# Altium integrated library ATK-DLAM62LB V1.0.IntLib: 194 symbols
Pins are listed as number, name and electrical type; pins without a type are passive.

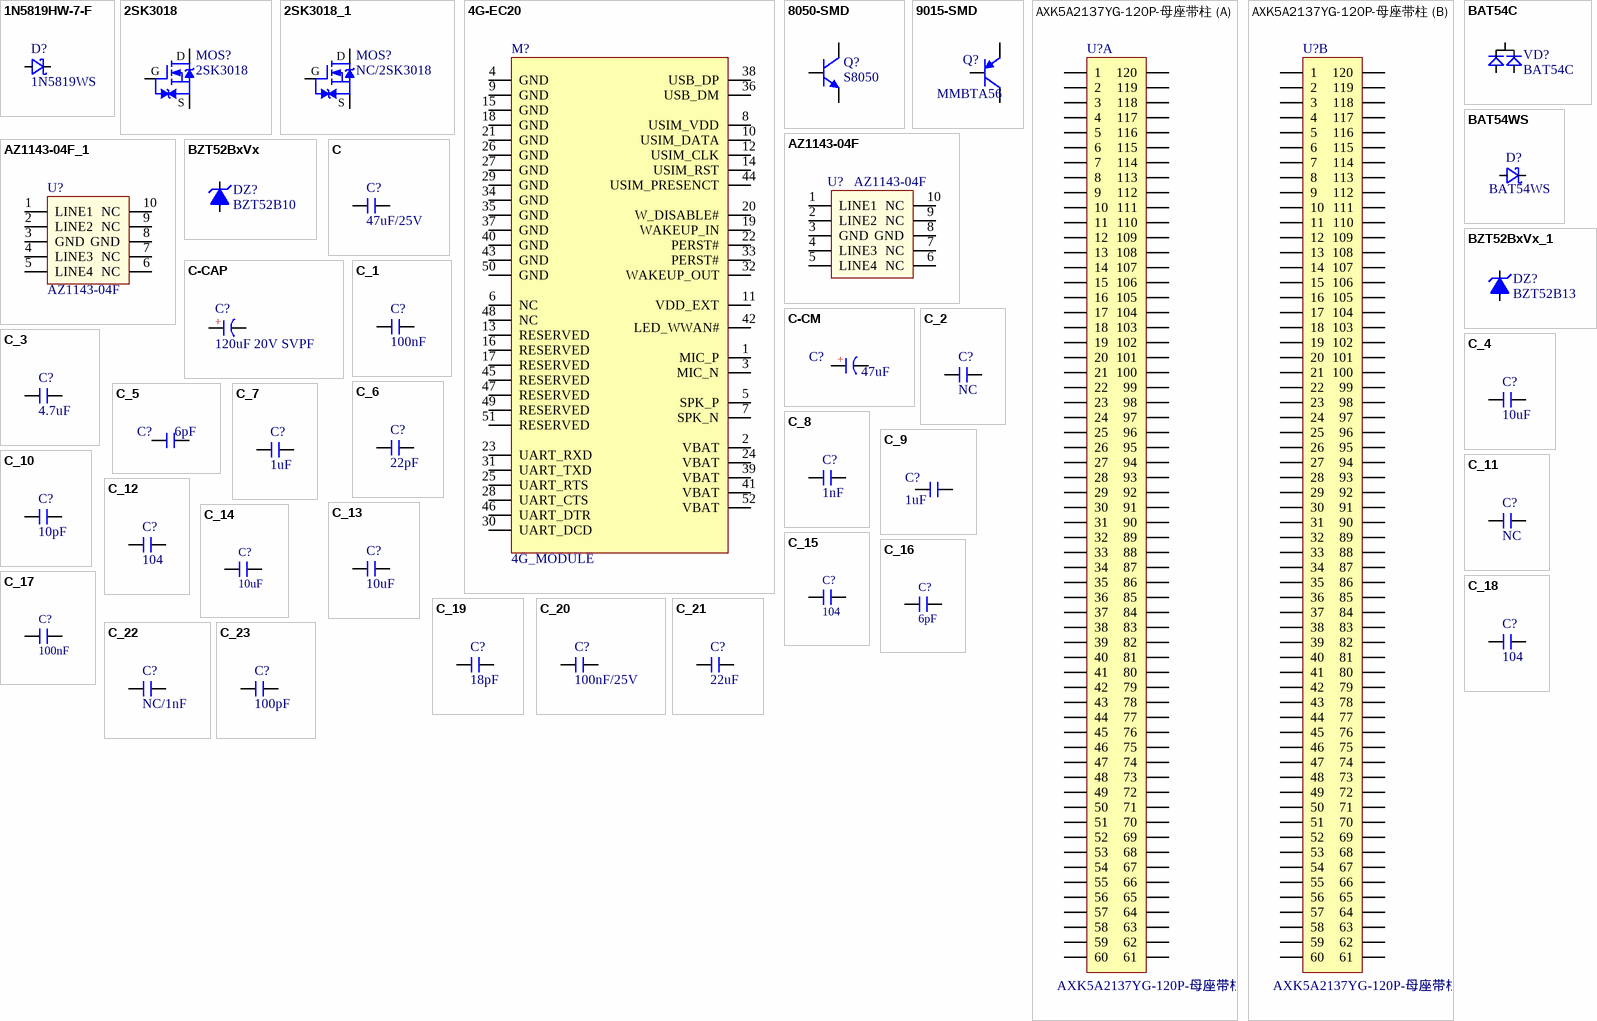
[diagram p0: symbols 1N5819HW-7-F to C_23]

## 1N5819HW-7-F
designator D?, comment 1N5819WS
肖特基二极管 40V  450mV@1A; 版权归属: 正点原子; 学习资源: www.openedv.com; Parameter: 肖特基二极管
footprint SOD-123 (2.7x1.6X1.1mm（长宽高，不包括引脚）)
footprint SOD-123FL (2.7x1.6X1.1mm（长宽高，不包括引脚）)
footprint SOD-323 (1.8x1.3X0.9mm（长宽高，不包括引脚）)
footprint SOD-123 (二极管)
pins: 1 A, 2 K

## 2SK3018
designator MOS?
NMOS  30V 0.1A@2.5V 8Ω; BOM名称: N沟场效应管; 版权归属: 正点原子; Parameter: MOS管; 学习资源: www.openedv.com
footprint SOT323-3L (2x2.2x0.9mm(长宽高))
footprint SOT323-3M (2x2.2x0.9mm(长宽高))
footprint SOT323-3N (2x2.2x0.9mm(长宽高))
footprint SOT23-3L (3x1.3x1mm(长宽高))
footprint SOT23-3N (3x1.3x1mm(长宽高))
footprint SOT23-3M (3x1.3x1mm(长宽高))
pins: 1 G, 2 S, 3 D

## 2SK3018_1
designator MOS?, comment NC/2SK3018
NMOS  30V 0.1A@2.5V 8Ω; BOM名称: N沟场效应管; 版权归属: 正点原子; Parameter: MOS管; 学习资源: www.openedv.com
footprint SOT323-3L (2x2.2x0.9mm(长宽高))
footprint SOT323-3M (2x2.2x0.9mm(长宽高))
footprint SOT323-3N (2x2.2x0.9mm(长宽高))
footprint SOT23-3L (3x1.3x1mm(长宽高))
footprint SOT23-3N (3x1.3x1mm(长宽高))
footprint SOT23-3M (3x1.3x1mm(长宽高))
footprint SOT323-3L (2x2.2x0.9mm(长宽高))
pins: 1 G, 2 S, 3 D

## 4G-EC20
designator M?, comment 4G_MODULE
Mini PCIE座子52P; 版权归属: 正点原子; Parameter: 接口器件; 学习资源: www.openedv.com
footprint Mini PCIE 52P
pins: 1 MIC_P, 2 VBAT, 3 MIC_N, 4 GND, 5 SPK_P, 6 NC, 7 SPK_N, 8 USIM_VDD, 9 GND, 10 USIM_DATA, 11 VDD_EXT, 12 USIM_CLK, 13 RESERVED, 14 USIM_RST, 15 GND, 16 RESERVED, 17 RESERVED, 18 GND, 19 WAKEUP_IN, 20 W_DISABLE#, 21 GND, 22 PERST#, 23 UART_RXD, 24 VBAT, 25 UART_RTS, 26 GND, 27 GND, 28 UART_CTS, 29 GND, 30 UART_DCD, 31 UART_TXD, 32 WAKEUP_OUT, 33 PERST#, 34 GND, 35 GND, 36 USB_DM, 37 GND, 38 USB_DP, 39 VBAT, 40 GND, 41 VBAT, 42 LED_WWAN#, 43 GND, 44 USIM_PRESENCT, 45 RESERVED, 46 UART_DTR, 47 RESERVED, 48 NC, 49 RESERVED, 50 GND, 51 RESERVED, 52 VBAT

## 8050-SMD
designator Q?, comment S8050
高频放大-NPN型; 版权归属: 正点原子; 属性: 40V 1.5A 1W 100MHZ; Parameter: 三极管; BOM名称: 高频放大-NPN型; 学习资源: www.ooocke.com
footprint SOT23-3N
footprint SOT23-3L (3x1.3x1mm(长宽高))
footprint SOT23-3M (3x1.3x1mm(长宽高))
footprint SOT323-3L (2x2.2x0.9mm(长宽高))
footprint SOT323-3N (2x2.2x0.9mm(长宽高))
footprint SOT323-3M (2x2.2x0.9mm(长宽高))
pins: 1 B, 2 E, 3 C

## 9015-SMD
designator Q?, comment MMBTA56
低噪放大-PNP型; BOM名称: 三极管; 版权归属: 正点原子; 属性: 50V 0.1A 0.4W 150MHZ; 学习资源: www.ooocke.com
footprint SOT23-3N (3x1.3x1mm(长宽高))
footprint SOT23-3L (3x1.3x1mm(长宽高))
footprint SOT23-3M (3x1.3x1mm(长宽高))
pins: 1 B, 2 E, 3 C

## AXK5A2137YG-120P-母座带柱
designator U?
footprint ATK-CLAM62LB-CORE (Footprint not found)
part A pins: A1 1, A2 2, A3 3, A4 4, A5 5, A6 6, A7 7, A8 8, A9 9, A10 10, A11 11, A12 12, A13 13, A14 14, A15 15, A16 16, A17 17, A18 18, A19 19, A20 20, A21 21, A22 22, A23 23, A24 24, A25 25, A26 26, A27 27, A28 28, A29 29, A30 30, A31 31, A32 32, A33 33, A34 34, A35 35, A36 36, A37 37, A38 38, A39 39, A40 40, A41 41, A42 42, A43 43, A44 44, A45 45, A46 46, A47 47, A48 48, A49 49, A50 50, A51 51, A52 52, A53 53, A54 54, A55 55, A56 56, A57 57, A58 58, A59 59, A60 60, A61 61, A62 62, A63 63, A64 64, A65 65, A66 66, A67 67, A68 68, A69 69, A70 70, A71 71, A72 72, A73 73, A74 74, A75 75, A76 76, A77 77, A78 78, A79 79, A80 80, A81 81, A82 82, A83 83, A84 84, A85 85, A86 86, A87 87, A88 88, A89 89, A90 90, A91 91, A92 92, A93 93, A94 94, A95 95, A96 96, A97 97, A98 98, A99 99, A100 100, A101 101, A102 102, A103 103, A104 104, A105 105, A106 106, A107 107, A108 108, A109 109, A110 110, A111 111, A112 112, A113 113, A114 114, A115 115, A116 116, A117 117, A118 118, A119 119, A120 120
part B pins: B1 1, B2 2, B3 3, B4 4, B5 5, B6 6, B7 7, B8 8, B9 9, B10 10, B11 11, B12 12, B13 13, B14 14, B15 15, B16 16, B17 17, B18 18, B19 19, B20 20, B21 21, B22 22, B23 23, B24 24, B25 25, B26 26, B27 27, B28 28, B29 29, B30 30, B31 31, B32 32, B33 33, B34 34, B35 35, B36 36, B37 37, B38 38, B39 39, B40 40, B41 41, B42 42, B43 43, B44 44, B45 45, B46 46, B47 47, B48 48, B49 49, B50 50, B51 51, B52 52, B53 53, B54 54, B55 55, B56 56, B57 57, B58 58, B59 59, B60 60, B61 61, B62 62, B63 63, B64 64, B65 65, B66 66, B67 67, B68 68, B69 69, B70 70, B71 71, B72 72, B73 73, B74 74, B75 75, B76 76, B77 77, B78 78, B79 79, B80 80, B81 81, B82 82, B83 83, B84 84, B85 85, B86 86, B87 87, B88 88, B89 89, B90 90, B91 91, B92 92, B93 93, B94 94, B95 95, B96 96, B97 97, B98 98, B99 99, B100 100, B101 101, B102 102, B103 103, B104 104, B105 105, B106 106, B107 107, B108 108, B109 109, B110 110, B111 111, B112 112, B113 113, B114 114, B115 115, B116 116, B117 117, B118 118, B119 119, B120 120

## AZ1143-04F
designator U?
ESD保护二极管阵列
footprint DFN2510P10E
pins: 1 LINE1, 2 LINE2, 3 GND, 4 LINE3, 5 LINE4, 6 NC, 7 NC, 8 GND, 9 NC, 10 NC

## AZ1143-04F_1
designator U?, comment AZ1143-04F
ESD保护二极管阵列
footprint DFN2510P10E
pins: 1 LINE1, 2 LINE2, 3 GND, 4 LINE3, 5 LINE4, 6 NC, 7 NC, 8 GND, 9 NC, 10 NC

## BAT54C
designator VD?
肖特基二极管（双）
footprint SOT23-3N
footprint SOT23-3L (3x1.3x1mm(长宽高))
footprint SOT23-3M (3x1.3x1mm(长宽高))
pins: 1, 2, 3

## BAT54WS
designator D?
肖特基二极管 30V  1V@100mA; 版权归属: 正点原子; 学习资源: www.openedv.com; Parameter: 肖特基二极管
footprint SOD-323
pins: 1 A, 2 K

## BZT52BxVx
designator DZ?, comment BZT52B10
CJ x.xV / 0.5W稳压管  2%; 版权归属: 正点原子; BOM名称: 二极管(稳压); 学习资源: www.openedv.com
footprint SOD-123 (2.7x1.6X1.1mm（长宽高，不包括引脚）)
footprint SMB (二极管 SMB)
footprint SOD-123
pins: 1 A, 2 K

## BZT52BxVx_1
designator DZ?, comment BZT52B13
CJ x.xV / 0.5W稳压管  2%; 版权归属: 正点原子; BOM名称: 二极管(稳压); 学习资源: www.openedv.com
footprint SOD-123 (2.7x1.6X1.1mm（长宽高，不包括引脚）)
footprint Model Name (Model Description)
footprint Model Name (Model Description)
footprint SMB (二极管 SMB)
footprint SOD-123 (二极管)
pins: 1 A, 2 K

## C
designator C?, comment 47uF/25V
无极性电容; BOM名称: 无极性贴片电容; 版权归属: 正点原子; 学习资源: www.openedv.com
footprint C 0201 (无极性贴片电容)
footprint C 0402 (无极性贴片电容)
footprint C 0603 (无极性贴片电容)
footprint C 0805 (无极性贴片电容)
footprint C 1206 (无极性贴片电容)
footprint C 1210 (无极性贴片电容)
footprint C 1808 (无极性贴片电容)
footprint C 1812 (无极性贴片电容)
footprint C 1825 (无极性贴片电容)
footprint C 2225 (无极性贴片电容)
pins: 1, 2

## C-CAP
designator C?, comment 120uF 20V SVPF
有极性电容; 版权归属: 正点原子; 学习资源: www.openedv.com; BOM名称: 有极性电容
footprint CA 0805 (有极性贴片电容(0805))
footprint CA 2012 (有极性贴片电容(2012))
footprint CA 3216 (有极性贴片电容(3216))
footprint CA 3528 (有极性贴片电容(3528))
footprint CA 6032 (有极性贴片电容(6032))
footprint CA 7343 (有极性贴片电容(7343))
footprint CD 6.3*5.4 S (有极性贴片电容(直径6.3mm高5.4mm))
footprint CD 5.0*10*16 T (有极性直插电容(脚距5mm直径10mm高度16mm))
footprint CD 2.5*5*11 T (有极性直插电容(脚距2.5mm直径5mm高度11mm))
footprint CD 6.3*7.7 S (有极性贴片电容直径6.3mm高度7.7mm))
pins: 1 A, 2 K
text: +

## C-CM
designator C?, comment 47uF
贴片电解电容; 版权归属: 正点原子; BOM名称: 贴片电解电容; 学习资源: www.openedv.com
footprint CM B(4*5.4)
pins: 1 A, 2 K
text: +

## C_1
designator C?, comment 100nF
无极性电容; BOM名称: 无极性贴片电容; 版权归属: 正点原子; 学习资源: www.openedv.com
footprint C 0603 (无极性贴片电容(0603))
pins: 1, 2

## C_2
designator C?, comment NC
无极性电容; BOM名称: 无极性贴片电容; 版权归属: 正点原子; 学习资源: www.openedv.com
footprint C 0603 (无极性贴片电容(0603))
pins: 1, 2

## C_3
designator C?, comment 4.7uF
无极性电容; BOM名称: 无极性贴片电容; 版权归属: 正点原子; 学习资源: www.openedv.com
footprint C 0201 (无极性贴片电容)
footprint C 0402 (无极性贴片电容)
footprint C 0603 (无极性贴片电容)
footprint C 0805 (无极性贴片电容)
footprint C 1206 (无极性贴片电容)
footprint C 1210 (无极性贴片电容)
footprint C 1808 (无极性贴片电容)
footprint C 1812 (无极性贴片电容)
footprint C 1825 (无极性贴片电容)
footprint C 2225 (无极性贴片电容)
pins: 1, 2

## C_4
designator C?, comment 10uF
无极性电容; BOM名称: 无极性贴片电容; 版权归属: 正点原子; 学习资源: www.openedv.com
footprint C 0603 (无极性贴片电容(0603))
pins: 1, 2

## C_5
designator C?, comment 6pF
无极性贴片电容; 版权归属: 正点原子; BOM名称: 无极性贴片电容; 学习资源: www.openedv.com
footprint C 0402 (无极性贴片电容)
pins: 1, 2

## C_6
designator C?, comment 22pF
无极性电容; BOM名称: 无极性贴片电容; 版权归属: 正点原子; 学习资源: www.openedv.com
footprint C 0603 (无极性贴片电容(0603))
pins: 1, 2

## C_7
designator C?, comment 1uF
50V 10% 无极性贴片电容; BOM名称: 电容; 版权归属: 正点原子; 学习资源: www.openedv.com
footprint C 0201 (无极性贴片电容)
footprint C 0402 (无极性贴片电容)
footprint C 0603 (无极性贴片电容)
footprint C 0805 (无极性贴片电容)
footprint C 1206 (无极性贴片电容)
footprint C 1210 (无极性贴片电容)
footprint C 1808 (无极性贴片电容)
footprint C 1812 (无极性贴片电容)
footprint C 1825 (无极性贴片电容)
footprint C 2225 (无极性贴片电容)
footprint C 0805 (无极性贴片电容)
pins: 1, 2

## C_8
designator C?, comment 1nF
无极性电容; BOM名称: 无极性贴片电容; 版权归属: 正点原子; 学习资源: www.openedv.com
footprint C 0603 (无极性贴片电容(0603))
pins: 1, 2

## C_9
designator C?, comment 1uF
无极性电容; BOM名称: 无极性贴片电容; 版权归属: 正点原子; 学习资源: www.openedv.com
footprint C 0603 (无极性贴片电容(0603))
pins: 1, 2

## C_10
designator C?, comment 10pF
无极性贴片电容; 版权归属: 源创客; BOM名称: 无极性贴片电容; 学习资源: www.ooocke.com
footprint C 0402 (无极性贴片电容)
pins: 1, 2

## C_11
designator C?, comment NC
无极性贴片电容; 版权归属: 源创客; BOM名称: 无极性贴片电容; 学习资源: www.ooocke.com
footprint C 0201 (无极性贴片电容)
footprint C 0402 (无极性贴片电容)
footprint C 0603 (无极性贴片电容)
footprint C 0805 (无极性贴片电容)
footprint C 1206 (无极性贴片电容)
footprint C 1210 (无极性贴片电容)
footprint C 1808 (无极性贴片电容)
footprint C 1812 (无极性贴片电容)
footprint C 1825 (无极性贴片电容)
footprint C 2225 (无极性贴片电容)
pins: 1, 2

## C_12
designator C?, comment 104
无极性贴片电容; 版权归属: 源创客; BOM名称: 无极性贴片电容; 学习资源: www.ooocke.com
footprint C 0603 (无极性贴片电容(0603))
pins: 1, 2

## C_13
designator C?, comment 10uF
无极性贴片电容; 版权归属: 源创客; BOM名称: 无极性贴片电容; 学习资源: www.ooocke.com
footprint C 0201 (无极性贴片电容)
footprint C 0402 (无极性贴片电容)
footprint C 0603 (无极性贴片电容)
footprint C 0805 (无极性贴片电容)
footprint C 1206 (无极性贴片电容)
footprint C 1210 (无极性贴片电容)
footprint C 1808 (无极性贴片电容)
footprint C 1812 (无极性贴片电容)
footprint C 1825 (无极性贴片电容)
footprint C 2225 (无极性贴片电容)
pins: 1, 2

## C_14
designator C?, comment 10uF
无极性贴片电容; 版权归属: 源创客; BOM名称: 无极性贴片电容; 学习资源: www.ooocke.com
footprint C 0201 (无极性贴片电容)
footprint C 0402 (无极性贴片电容)
footprint C 0603 (无极性贴片电容(0603))
footprint C 0805 (无极性贴片电容)
footprint C 1206 (无极性贴片电容)
footprint C 1210 (无极性贴片电容)
footprint C 1808 (无极性贴片电容)
footprint C 1812 (无极性贴片电容)
footprint C 1825 (无极性贴片电容)
footprint C 2225 (无极性贴片电容)
pins: 1, 2

## C_15
designator C?, comment 104
无极性贴片电容; 版权归属: 源创客; BOM名称: 无极性贴片电容; 学习资源: www.ooocke.com
footprint C 0402 (无极性贴片电容)
pins: 1, 2

## C_16
designator C?, comment 6pF
无极性贴片电容; 版权归属: 源创客; BOM名称: 无极性贴片电容; 学习资源: www.ooocke.com
footprint C 0402 (无极性贴片电容)
pins: 1, 2

## C_17
designator C?, comment 100nF
无极性贴片电容; 版权归属: 源创客; BOM名称: 无极性贴片电容; 学习资源: www.ooocke.com
footprint C 0402 (无极性贴片电容)
pins: 1, 2

## C_18
designator C?, comment 104
无极性电容; BOM名称: 无极性贴片电容; 版权归属: 正点原子; 学习资源: www.openedv.com
footprint C 0603 (无极性贴片电容(0603))
pins: 1, 2

## C_19
designator C?, comment 18pF
无极性电容; BOM名称: 无极性贴片电容; 版权归属: 正点原子; 学习资源: www.openedv.com
footprint C 0603 (无极性贴片电容(0603))
pins: 1, 2

## C_20
designator C?, comment 100nF/25V
无极性电容; BOM名称: 无极性贴片电容; 版权归属: 正点原子; 学习资源: www.openedv.com
footprint C 0201 (无极性贴片电容)
footprint C 0402 (无极性贴片电容)
footprint C 0603 (无极性贴片电容)
footprint C 0805 (无极性贴片电容)
footprint C 1206 (无极性贴片电容)
footprint C 1210 (无极性贴片电容)
footprint C 1808 (无极性贴片电容)
footprint C 1812 (无极性贴片电容)
footprint C 1825 (无极性贴片电容)
footprint C 2225 (无极性贴片电容)
pins: 1, 2

## C_21
designator C?, comment 22uF
无极性电容; BOM名称: 无极性贴片电容; 版权归属: 正点原子; 学习资源: www.openedv.com
footprint C 0805 (无极性贴片电容(0805))
pins: 1, 2

## C_22
designator C?, comment NC/1nF
无极性电容; BOM名称: 无极性贴片电容; 版权归属: 正点原子; 学习资源: www.openedv.com
footprint C 0603 (无极性贴片电容(0603))
pins: 1, 2

## C_23
designator C?, comment 100pF
无极性电容; BOM名称: 无极性贴片电容; 版权归属: 正点原子; 学习资源: www.openedv.com
footprint C 0402 (无极性贴片电容(0402))
pins: 1, 2

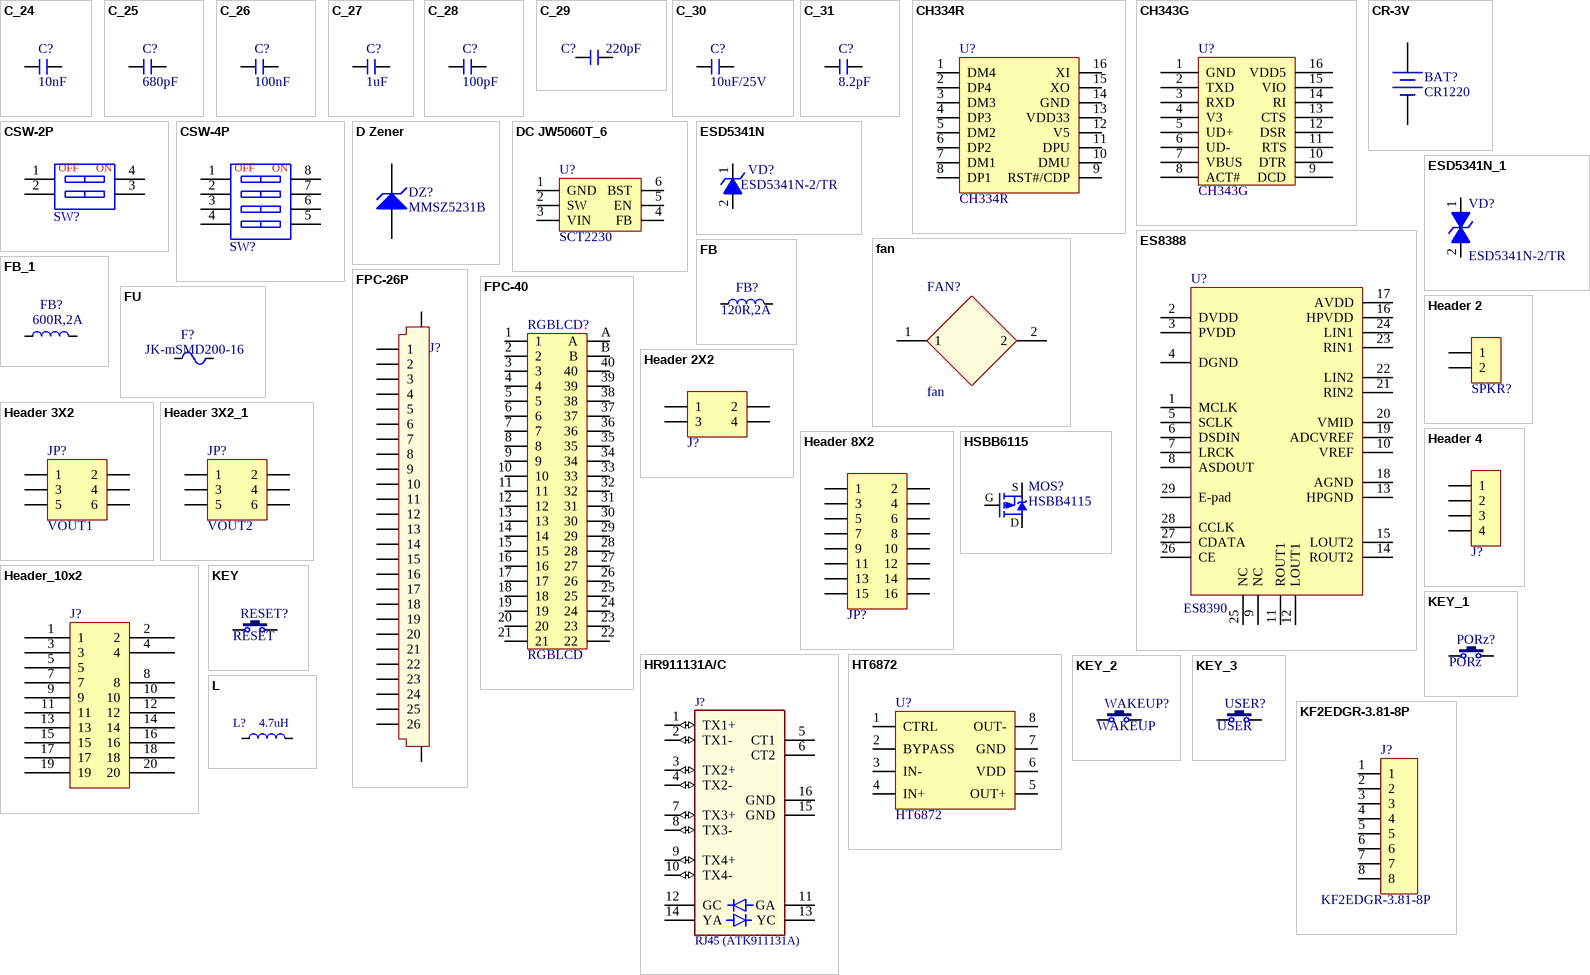
[diagram p1: symbols C_24 to L]

## C_24
designator C?, comment 10nF
无极性电容; BOM名称: 无极性贴片电容; 版权归属: 正点原子; 学习资源: www.openedv.com
footprint C 0603 (无极性贴片电容(0603))
pins: 1, 2

## C_25
designator C?, comment 680pF
无极性电容; BOM名称: 无极性贴片电容; 版权归属: 正点原子; 学习资源: www.openedv.com
footprint C 0402 (无极性贴片电容(0402))
pins: 1, 2

## C_26
designator C?, comment 100nF
无极性贴片电容; 版权归属: 源创客; BOM名称: 无极性贴片电容; 学习资源: www.ooocke.com
footprint C 0402 (无极性贴片电容(0402))
pins: 1, 2

## C_27
designator C?, comment 1uF
无极性贴片电容; 版权归属: 源创客; BOM名称: 无极性贴片电容; 学习资源: www.ooocke.com
footprint C 0402 (无极性贴片电容(0402))
pins: 1, 2

## C_28
designator C?, comment 100pF
无极性贴片电容; 版权归属: 源创客; BOM名称: 无极性贴片电容; 学习资源: www.ooocke.com
footprint C 0402 (无极性贴片电容(0402))
pins: 1, 2

## C_29
designator C?, comment 220pF
无极性贴片电容; 版权归属: 源创客; BOM名称: 无极性贴片电容; 学习资源: www.ooocke.com
footprint C 0402 (无极性贴片电容(0402))
pins: 1, 2

## C_30
designator C?, comment 10uF/25V
无极性贴片电容; 版权归属: 正点原子; BOM名称: 无极性贴片电容; 学习资源: www.openedv.com
footprint C 0201 (无极性贴片电容)
footprint C 0402 (无极性贴片电容)
footprint C 0603 (无极性贴片电容)
footprint C 0805 (无极性贴片电容)
footprint C 1206 (无极性贴片电容)
footprint C 1210 (无极性贴片电容)
footprint C 1808 (无极性贴片电容)
footprint C 1812 (无极性贴片电容)
footprint C 1825 (无极性贴片电容)
footprint C 2225 (无极性贴片电容)
footprint C 0603 (无极性贴片电容(0603))
pins: 1, 2

## C_31
designator C?, comment 8.2pF
无极性电容; BOM名称: 无极性贴片电容; 版权归属: 正点原子; 学习资源: www.openedv.com
footprint C 0603 (无极性贴片电容(0603))
pins: 1, 2

## CH334R
designator U?
4端口USB HUB控制器, USB2.0
footprint QSOP16
pins: 1 DM4, 2 DP4, 3 DM3, 4 DP3, 5 DM2, 6 DP2, 7 DM1, 8 DP1, 9 RST#/CDP, 10 DMU, 11 DPU, 12 V5, 13 VDD33, 14 GND, 15 XO, 16 XI

## CH343G
designator U?
footprint SOP16_M (10.3*6.2*1.8mm（长宽高）)
pins: 1 GND, 2 TXD, 3 RXD, 4 V3, 5 UD+, 6 UD-, 7 VBUS, 8 ACT#, 9 DCD, 10 DTR, 11 RTS, 12 DSR, 13 CTS, 14 RI, 15 VIO, 16 VDD5

## CR-3V
designator BAT?, comment CR1220
微型电池; 版权归属: 源创客; BOM名称: 微型电池; 学习资源: www.ooocke.com
footprint CR1220_A
footprint CR1220_B (纽扣电池座)
footprint ML621FE (可充电纽扣电池)
footprint CR2032_A (纽扣电池座)
footprint CR2032_B (纽扣电池座)
pins: 1 DC+, 2 DC-

## CSW-2P
designator SW?  (value not drawn)
2路编码开关; 版权归属: 正点原子; Parameter: 按键/开关; BOM名称: 2路编码开关; 学习资源: www.openedv.com
footprint CSW1.27 SMD-2P (长：4.14mm，宽：5.4mm，高：2.3mm)
footprint CSW 2.54 DIP-2P (拨码开关 2.54mm 2码4脚 直插)
footprint SW-TH_4P_DSIC02LHGET-1
footprint SW-TH_4P_DSIC02LHGET-1
pins: 1, 2, 3, 4
text: OFF; ON

## CSW-4P
designator SW?  (value not drawn)
4路编码开关; 版权归属: 正点原子; Parameter: 按键/开关; BOM名称: 4路编码开关; 学习资源: www.openedv.com
footprint CSW DIP-4P (11.7*9.9*7mm)
footprint CSW DIP-4P_G (11.7*9.9*7mm)
footprint CSW1.27 SMD-4P (长：6.68mm，宽：5.4mm，高：2.3mm)
pins: 1, 2, 3, 4, 5, 6, 7, 8
text: OFF; ON

## D Zener
designator DZ?, comment MMSZ5231B
存货编码: 1110501012; 序号: 2494; 存货名称: 稳压二极管; 规格型号: MMSZ5231B,SOD-123; Published: 8-Jun-2000; LatestRevisionDate: 17-Jul-2002; LatestRevisionNote: Re-released for DXP Platform.; PackageReference: DIODE-0.7; Publisher: Altium Limited; PackageDescription: Diode, Thru-Hole; 2 Leads; 0.7 in Pin Spacing; Value: MMSZ5231B
footprint SOD-123
pins: 1 A, 2 K

## DC JW5060T_6
designator U?, comment SCT2230
DC降压芯片
footprint SOT23-6L (3x1.6x1.1mm(长宽高))
footprint SOT23-6M (3x1.6x1.1mm(长宽高))
footprint SOT23-6N
pins: 1 GND, 2 SW, 3 VIN, 4 FB, 5 EN, 6 BST

## ES8388
designator U?, comment ES8390
音频芯片
footprint QFN28 4X4_L
pins: 1 MCLK, 2 DVDD, 3 PVDD, 4 DGND, 5 SCLK, 6 DSDIN, 7 LRCK, 8 ASDOUT, 9 NC, 10 VREF, 11 ROUT1, 12 LOUT1, 13 HPGND, 14 ROUT2, 15 LOUT2, 16 HPVDD, 17 AVDD, 18 AGND, 19 ADCVREF, 20 VMID, 21 RIN2, 22 LIN2, 23 RIN1, 24 LIN1, 25 NC, 26 CE, 27 CDATA, 28 CCLK, 29 E-pad

## ESD5341N
designator VD?, comment ESD5341N-2/TR
ESD二极管-单向
footprint ESD0402
pins: 1, 2

## ESD5341N_1
designator VD?, comment ESD5341N-2/TR
ESD二极管-单向
footprint ESD0402
pins: 1, 2

## fan
designator FAN?
footprint 40*40mm fan
footprint 40*40mm fan 55mm (Footprint not found)
footprint 40*40mm fan (南北桥散热器对角59mm)
pins: 1, 2

## FB
designator FB?, comment 120R,2A
贴片磁珠; BOM名称: 小功率贴片电感; 版权归属: 正点原子; Parameter: 电感/磁珠; 学习资源: www.openedv.com
footprint L 0402 (小功率贴片电感)
footprint L 0603 (小功率贴片电感)
footprint L 0805 (小功率贴片电感)
footprint L 1206 (小功率贴片电感)
footprint L 1210 (小功率贴片电感)
footprint L 1806 (小功率贴片电感)
footprint L 1812 (小功率贴片电感)
footprint L 1008 (2.5mm*2.0mm*1.2mm(长*宽*高）)
footprint L_2520
pins: 1, 2

## FB_1
designator FB?, comment 600R,2A
贴片磁珠; BOM名称: 小功率贴片电感; 版权归属: 正点原子; Parameter: 电感/磁珠; 学习资源: www.openedv.com
footprint L 0402 (小功率贴片电感)
footprint L 0603 (小功率贴片电感)
footprint L 0805 (小功率贴片电感)
footprint L 1206 (小功率贴片电感)
footprint L 1210 (小功率贴片电感)
footprint L 1806 (小功率贴片电感)
footprint L 1812 (小功率贴片电感)
footprint L 1008 (2.5mm*2.0mm*1.2mm(长*宽*高）)
footprint L_2520
pins: 1, 2

## FPC-26P
designator J?, comment FPC0.5-26P  (value not drawn)
FPC连接器; 版权归属: 正点原子; Parameter: 接口器件; BOM名称: FPC连接器; 学习资源: www.openedv.com
footprint FPC 1.25 26P V-T (FPC插座1.25mm 26P 立式直插)
footprint FPC 1.0 26P H-S (FPC座1.0mm 26P 卧式贴片)
footprint FPC 0.5 26P H-S (FPC座 0.5mm 26P 卧式贴片)
footprint FPC 0.5 26P V-S (FPC座 0.5mm 26P 立式贴片)
footprint HEADER 2.0 2X11P (2.0mm 直插排针)
footprint FPC 0.5 26P V-S (FPC座 0.5mm 26P 立式贴片)
pins: 0, 0, 1, 2, 3, 4, 5, 6, 7, 8, 9, 10, 11, 12, 13, 14, 15, 16, 17, 18, 19, 20, 21, 22, 23, 24, 25, 26

## FPC-40
designator RGBLCD?, comment RGBLCD
FPC-40P-0.5mm
footprint FPC0.5-TOP40P (FPCTOP;0.5mm;)
pins: 1, 2, 3, 4, 5, 6, 7, 8, 9, 10, 11, 12, 13, 14, 15, 16, 17, 18, 19, 20, 21, 22, 23, 24, 25, 26, 27, 28, 29, 30, 31, 32, 33, 34, 35, 36, 37, 38, 39, 40, A, B

## FU
designator F?, comment JK-mSMD200-16
贴片保险丝; 版权归属: 源创客; BOM名称: 贴片保险丝; 学习资源: www.ooocke.com
footprint FU 0402 (贴片保险丝)
footprint FU 0603 (贴片保险丝)
footprint FU 0805 (贴片保险丝)
footprint FU 1206 (贴片保险丝)
footprint FU 1210 (贴片保险丝)
footprint FU 1812 (贴片保险丝)
pins: 1, 2

## Header 2
designator SPKR?, comment Header 1X2  (value not drawn)
2P接插件; 版权归属: 正点原子; Parameter: 接插件; BOM名称: 2P接插件; 学习资源: www.openedv.com
footprint Header 2.54 1X2P (排针(1X2P,2.54,直插))
footprint Header 2.54 1X2P-H (排针(1X2P,2.54,弯插))
footprint Header 2.54 1X2P-H-S (排针(1X2P,2.54,卧贴))
footprint Header 2.0 1X2P (排针(1X2P,2.0,直插))
footprint Header 1.27 1X2P (排针(1*2P,1.27,直插))
footprint MX1.25-2P V-S (MX座子1.25mm 2P 立式贴片)
footprint PH2.0-2P V-T (PH座子2.0mm 2P 立式直插)
footprint PH2.0-2P H-T (PH座子2.0mm 2P 卧式弯插)
footprint PH2.0-2P H-S (PH座子2.0mm 2P 卧式贴片)
footprint XH2.54-2P H-S (XH座子 2.54mm 2P 卧式贴片)
footprint XH2.54-2P H-T (XH座子 2.54mm 2P 卧式弯插)
footprint XH2.54-2P V-T (XH座子 2.54mm 2P 立式直插)
footprint VH3.96-2P V-T (VH座子3.96mm 2P 立式直插)
footprint VH3.96-2P H-T (VH座子3.96mm 2P 卧式弯插)
footprint HT3.96R-2P H-T (PCB接线端子HT3.96R 2P 弯针插座)
footprint HT508-2P (PCB接线端子HT508 5.08mm 2P 卧式弯插)
footprint HB9500-2P (PCB接线端子HB9500 9.5mm 2P 卧式弯插)
footprint Socket 2.0 1X2P (排座(1*2P,2.0,直插))
footprint Socket 2.54 1X2P (排座(1*2P,2.54,直插))
footprint Socket 2.54 1X2P-H-S (排座(1*2P,2.54,卧贴))
footprint Socket 2.54 1X2P-H (排座(1*2P,2.54弯插))
footprint KF2510-2P (PCB接线端子KF2510 2.54mm 2P 直插)
footprint KF350-2P (PCB接线端子KF350 3.5mm 2P 直插)
footprint KF301-2P (PCB接线端子KF301 5.0mm 2P 直插)
footprint KF128-5.08-2P (PCB接线端子KF128 5.08mm 2P 直插)
footprint KF128-3.81-2P (PCB接线端子KF128 3.81mm 2P 直插)
footprint KF2EDGK5.08-2P (PCB接线端子KF2EDGK 5.08mm 2P 立式直插)
footprint KF2EDGK5.08-2P_H (PCB接线端子KF2EDGK 5.08mm 2P 卧式弯插)
footprint KF2EDGK5.0-2P (PCB接线端子KF2EDGK 5.0mm 2P 立式直插)
footprint KF2EDGK5.0-2P_H (PCB接线端子KF2EDGK 5.0mm 2P 卧式弯插)
footprint KF2EDG-5.08-2P (PCB接线端子KF2EDG 5.08mm 2P 卧式直插)
footprint KF2EDG-3.81-2P (PCB接线端子KF2EDG 3.81mm 2P 卧式弯插)
footprint XHB2.54-2P H-T (XHB座子 2.54mm 2P 卧式弯插)
footprint KF128-5.08-2P CAN (PCB接线端子KF128 5.08mm 2P 直插)
footprint KF128-5.08-2P CAN (PCB接线端子KF128 5.08mm 2P 直插)
pins: 1, 2

## Header 2X2
designator J?, comment Header2X2  (value not drawn)
2*2P接插件; 版权归属: 正点原子; Parameter: 接插件; BOM名称: 2*2P接插件; 学习资源: www.openedv.com
footprint Socket 2.54 2X2P (排座(2*2P,2.54,直插))
footprint Socket 2.54 2X2P-H (排座(2*2P,2.54弯插))
footprint Socket 2.54 2X2P-S (排座(2*2P,2.54,立贴))
footprint Header 2.54 2X2P (排针(2X2P,2.54,直插))
footprint Header 2.54 2X2P-H (排针(2X2P,2.54,弯插))
footprint Header 2.54 2X2P-S (排针(2X2P,2.54,立贴))
footprint PHB2.0-2x2P V-T (PHB座子 2.0mm 2X2P 立式直插)
footprint PHD2.0-2x2P V-T (PHD座子 2.0mm 2X2P 立式直插)
pins: 1, 2, 3, 4

## Header 3X2
designator JP?, comment VOUT1
3*2P接插件; 版权归属: 源创客; BOM名称: 3*2P接插件; 学习资源: www.ooocke.com
footprint HDR-3X2
footprint IDC2.54-6P (6P简易牛角座)
footprint HDR-3X2_H (双排弯脚排针，3x2脚)
footprint PHB2.0-2x3 (长：8mm，宽：7.3mm，高：7.8mm)
footprint PHD2.0-2x3P (6脚，长：8mm，宽：5mm，高：6.5mm)
footprint HDR2.54 2x3-M-SMD (脚距：2.54mm，贴片双排母)
pins: 1, 2, 3, 4, 5, 6

## Header 3X2_1
designator JP?, comment VOUT2
3*2P接插件; 版权归属: 源创客; BOM名称: 3*2P接插件; 学习资源: www.ooocke.com
footprint HDR-3X2
footprint IDC2.54-6P (6P简易牛角座)
footprint HDR-3X2_H (双排弯脚排针，3x2脚)
footprint PHB2.0-2x3 (长：8mm，宽：7.3mm，高：7.8mm)
footprint PHD2.0-2x3P (6脚，长：8mm，宽：5mm，高：6.5mm)
footprint HDR2.54 2x3-M-SMD (脚距：2.54mm，贴片双排母)
pins: 1, 2, 3, 4, 5, 6

## Header 4
designator J?, comment HDR-1X4  (value not drawn)
4P接插件; 版权归属: 正点原子; Parameter: 接插件; BOM名称: 4P接插件; 学习资源: www.openedv.com
footprint HDR-1X4 (排针，4脚)
footprint HDR-1X4_M (排母，4脚)
footprint XH2.54-4P (接插件，4P)
footprint KF2510-4P (接插件/2A)
footprint VH3.96-4P_H (接插件，25V/5A)
footprint PH2.0 D-L-4P (接插件/1A)
footprint HDR-1X4_H (弯脚排针，4脚)
footprint HDR-1X4_Y (圆孔排母，4脚)
footprint XH2.54-4P_H (接插件，4P)
footprint PH2.0 D-W-4P (接插件/1A)
footprint KF301-4P (可拼接端子/6A)
footprint KF2EDGK5.0-4P (直列插拔式端子)
footprint KF2EDGK5.0-4P_H (弯角插拔式端子)
footprint KF7620-4P (30.5*12*12mm(长宽高))
footprint KF350-4P (可拼接端子/10A)
footprint KF128-3.81-4P (螺钉式接线端子，脚距3.81mm)
footprint KF128-5.08-4P (螺钉式接线端子，脚距5.08mm)
footprint VH3.96-4P (接插件，25V/5A)
footprint PH2.0 S-W-4P (长：12mm，宽：7.6mm，高：5.5mm)
footprint KF2EDGK5.08-4P (直列插拔式端子)
footprint KF2EDGK5.08-4P_H (弯角插拔式端子)
footprint HDR2.54 S-W-4P (4P卧式贴片排针2.54)
footprint HDR2.54 S-W-4P_M (4P卧式贴片排母2.54)
footprint SH1.0 S-W-4P (SH1.0MM间距卧贴连接座子)
footprint HDR2.0 -1X4
footprint HDR-1x4-1.25MM
footprint SH1.0 S-L-4P (SH1.0MM间距立式连接座子)
footprint HT3.96R-4P_H (接插件，250V/8A)
footprint PH2.0 D-L-4P (接插件/1A)
pins: 1, 2, 3, 4

## Header 8X2
designator JP?  (value not drawn)
8*2P接插件; 版权归属: 正点原子; Parameter: 接插件; BOM名称: 8*2P接插件; 学习资源: www.openedv.com
footprint HDR-8X2 (双排排针，8x2脚)
footprint IDC2.54-16P (16P简易牛角座)
footprint HDR-8X2_H (双排弯脚排针，8x2脚)
footprint PHB2.0-2x8 (长：18mm，宽：7.3mm，高：7.8mm)
footprint PHD2.0-2x8P (16脚，长：18mm，宽：5mm，高：6.5mm)
footprint HDR2.54 2x8-M-SMD (脚距：2.54mm，贴片双排母)
pins: 1, 2, 3, 4, 5, 6, 7, 8, 9, 10, 11, 12, 13, 14, 15, 16

## Header_10x2
designator J?
CON HDR 2X10 1.27MM PITCH ST SMD
footprint HDR_2X10_FTR-110-51-D-06_S_S_8-7
footprint HEADER10*2_1.27_SPZ_SMT
pins: 1, 2, 3, 4, 5, 7, 8, 9, 10, 11, 12, 13, 14, 15, 16, 17, 18, 19, 20

## HR911131A/C
designator J?, comment RJ45 (ATK911131A)
千兆以太网接口
footprint HR911131C (千兆网络RJ45座子)
footprint HR911131A (千兆网络RJ45座子)
pins: 1 TX1+ (io), 2 TX1- (io), 3 TX2+ (io), 4 TX2- (io), 5 CT1, 6 CT2, 7 TX3+ (io), 8 TX3- (io), 9 TX4+ (io), 10 TX4- (io), 11 GA, 12 GC, 13 YC, 14 YA, 15 GND (power), 16 GND (power)

## HSBB6115
designator MOS?, comment HSBB4115
PMOS -60V -8A@-4.5V 33mΩ; BOM名称: MOS管; 版权归属: 正点原子; 学习资源: www.openedv.com
footprint DFN3.3x3.3_8L_EP1
footprint VDFN10-3X3
footprint DFN8_ 3x3
pins: 1 S, 2 S, 3 G, 4 G, 5 D, 6 D, 7 D, 8 D

## HT6872
designator U?
功放-4.7W单声道D类功放
footprint SOP8_N (5*6*1.8mm（长宽高）)
footprint SOP8_M (5*6*1.8mm（长宽高）)
footprint SOP8_L (5*6*1.8mm（长宽高）)
pins: 1 CTRL, 2 BYPASS, 3 IN-, 4 IN+, 5 OUT+, 6 VDD, 7 GND, 8 OUT-

## KEY
designator RESET?, comment RESET
按键; BOM名称: 3x6轻触开关; 版权归属: 正点原子; 学习资源: www.openedv.com
footprint TSW DIP-6*6*5 (6*6*5mm)
footprint TSW SMD-2S
footprint TSW SMD-3*6*2.5 (3*6*2.5mm)
footprint TSW SMD-3*6*4.3 (3*6*4.3mm)
footprint TSW SMD-3*6*5 (3*6*5mm)
footprint KEY_SOP324225 (KEY,3.2mm*4.2mm*2.5mm)
pins: 1, 2

## KEY_1
designator PORz?, comment PORz
按键; BOM名称: 3x6轻触开关; 版权归属: 正点原子; 学习资源: www.openedv.com
footprint TSW DIP-6*6*5 (6*6*5mm)
footprint TSW SMD-2S
footprint TSW SMD-3*6*2.5 (3*6*2.5mm)
footprint TSW SMD-3*6*4.3 (3*6*4.3mm)
footprint TSW SMD-3*6*5 (3*6*5mm)
footprint KEY_SOP324225 (KEY,3.2mm*4.2mm*2.5mm)
pins: 1, 2

## KEY_2
designator WAKEUP?, comment WAKEUP
按键; BOM名称: 3x6轻触开关; 版权归属: 正点原子; 学习资源: www.openedv.com
footprint TSW DIP-6*6*5 (6*6*5mm)
footprint TSW SMD-2S
footprint TSW SMD-3*6*2.5 (3*6*2.5mm)
footprint TSW SMD-3*6*4.3 (3*6*4.3mm)
footprint TSW SMD-3*6*5 (3*6*5mm)
footprint KEY_SOP324225 (KEY,3.2mm*4.2mm*2.5mm)
pins: 1, 2
